# Altium footprint library Sajad_Altium_Library.PcbLib: 380 footprints (part 2 of 24)
Each footprint in its own frame and in the unit in brackets; x right, y up, seen from the top. Pads: shape width x height; smd on the part's side, far side on the other; paste and mask are expansions set on the pad; w line width, h text height; cw(c..) or ccw(c..) is an arc to the next point about the centre after c.
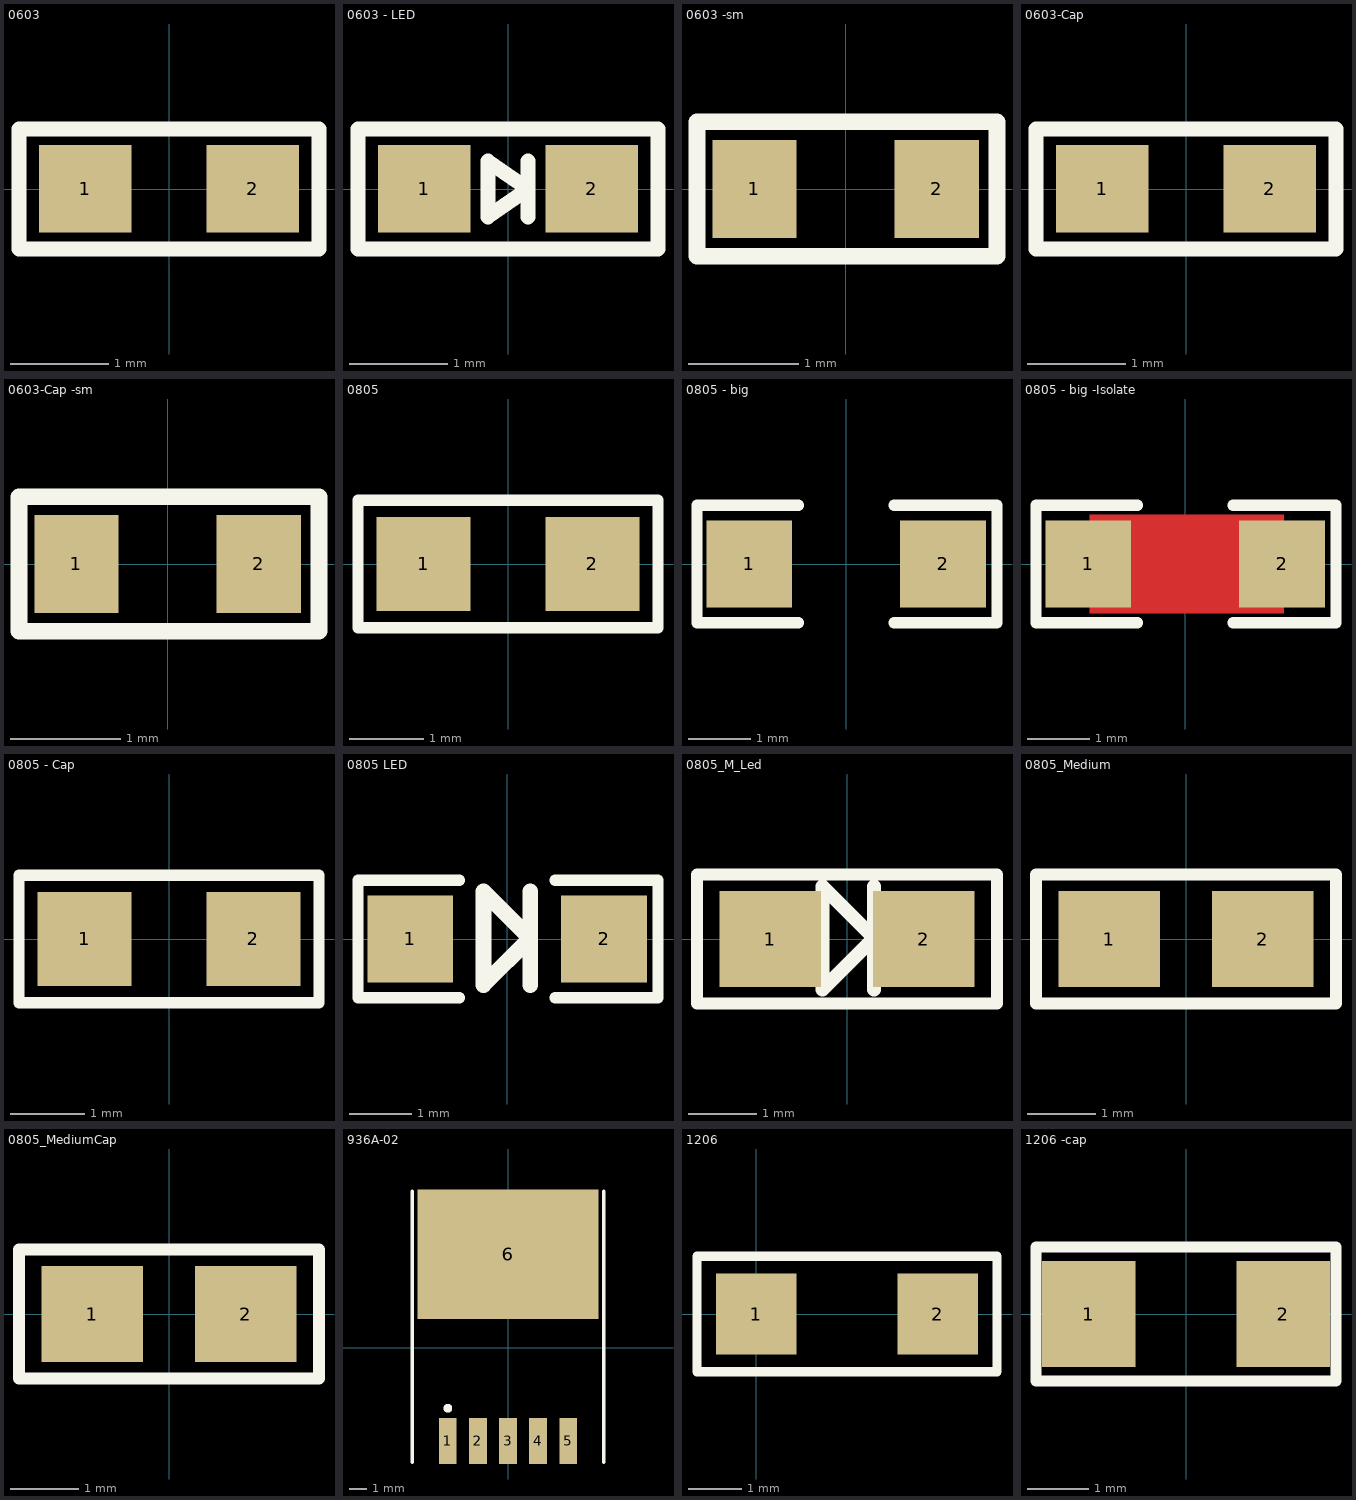
[diagram p1: the footprints below, top view; thin cyan lines are the x and y axes]

## 0603 [mil]
pads (2):
  rect 37x35 smd: 1(-33.5,0) 2(33.5,0)
Top Overlay:
  lines w6: -60,-24 0,-24 60,-24 60,24 0,24 -60,24 -60,-24
3D body: height 11.89, standoff 0, extent -31.49,-15.74 31.5,15.75

## 0603 - LED [mil]
pads (2):
  rect 37x35 smd: 1(-33.5,0) 2(33.5,0)
Top Overlay:
  lines w4: 8,-11.12 8,11.12 ; -8.06,-11.12 -8.06,11.12 8,0 -8.06,-11.12
  lines w6: 8,-11.12 8,11.12 ; -60,-24 -60,24 0,24 60,24 60,-24 0,-24 -60,-24 ; -8.06,-11.12 -8.06,11.12 8,0 -8.06,-11.12
3D body: height 43.31, standoff 0, extent -31.88,-15.74 31.9,15.75

## 0603 -sm [mil]
pads (2):
  rect 30x35 smd: 1(-32.5,0) 2(32.5,0)
Top Overlay:
  lines w6: -53,-24 0,-24 54,-24 54,24 0,24 -53,24 -53,-24
3D body: height 11.89, standoff 0, extent -31.49,-15.74 31.5,15.75

## 0603-Cap [mil]
pads (2):
  rect 37x35 smd: 1(-33.5,0) 2(33.5,0)
Top Overlay:
  lines w6: -60,-24 -60,24 0,24 60,24 60,-24 0,-24 -60,-24
3D body: height 31.5, standoff 0, extent -31.5,-15.75 31.5,15.75

## 0603-Cap -sm [mil]
pads (2):
  rect 30x35 smd: 1(-32.5,0) 2(32.5,0)
Top Overlay:
  lines w6: -53,-24 0,-24 54,-24 54,24 0,24 -53,24 -53,-24
3D body: height 31.5, standoff 0, extent -31.5,-15.75 31.5,15.75

## 0805 [mil]
pads (2):
  rect 50x50 smd: 1(-45,0) 2(45,0)
Top Overlay:
  lines w6: -80,-34 -80,34 80,34 80,-34 -80,-34
3D body: height 20.79, standoff 0, extent -57.67,-27.65 60.44,27.47

## 0805 - big [mil]
pads (2):
  rect 54x55 smd: 1(-61,0) 2(61,0)
Top Overlay:
  lines w7: -30,-37 -94,-37 -94,37 -30,37 ; 30,-37 95,-37 95,37 30,37
3D body: height 20.79, standoff 0, extent -57.67,-27.66 60.44,27.46

## 0805 - big -Isolate [mil]
pads (2):
  rect 54x55 smd: 1(-61,0) 2(61,0)
Top Layer:
  pour cut-out: -60,31 -60,-31 62,-31 62,31
Top Overlay:
  lines w7: -30,-37 -94,-37 -94,37 -30,37 ; 30,-37 95,-37 95,37 30,37
3D body: height 20.79, standoff 0, extent -57.67,-27.66 60.44,27.46

## 0805 - Cap [mil]
pads (2):
  rect 50x50 smd: 1(-45,0) 2(45,0)
Top Overlay:
  lines w6: -80,-34 -80,34 80,34 80,-34 -80,-34
3D body: height 23.62, standoff 0, extent -39.37,-24.61 39.37,24.6

## 0805 LED [mil]
pads (2):
  rect 54x55 smd: 1(-61,0) 2(61,0)
Top Overlay:
  lines w7: -30,-37 -94,-37 -94,37 -30,37 ; 30,-37 95,-37 95,37 30,37
  lines w10: 14.5,-29 14.5,30 ; -15,-29 -15,30 14.5,0.5 -15,-29
3D body: height 43.31, standoff 0, extent -39.76,-24.6 39.77,24.61

## 0805_M_Led [mil]
pads (2):
  rect 58x55 smd: 1(-44,0) 2(44,0)
Top Overlay:
  lines w7: -86,-37 86,-37 86,37 -86,37 -86,-37
  lines w8: 15.5,-29 15.5,30 ; -14,-29 15.5,0.5 -14,30 -14,-29
3D body: height 43.31, standoff 0, extent -39.76,-24.6 39.77,24.61

## 0805_Medium [mil]
pads (2):
  rect 58x55 smd: 1(-44,0) 2(44,0)
Top Overlay:
  lines w7: -86,-37 -86,37 86,37 86,-37 -86,-37
3D body: height 29.92, standoff 0, extent -75.27,-26.58 75.25,26.57

## 0805_MediumCap [mil]
pads (2):
  rect 58x55 smd: 1(-44,0) 2(44,0)
Top Overlay:
  lines w7: -86,-37 -86,37 86,37 86,-37 -86,-37
3D body: height 24.8, standoff 1.18, extent -62.34,-24.6 62.35,24.62

## 936A-02 [mm] "D2-PAK; 5 Leads; Body 14.7 (inc. leads) x 10.2 mm (LxW max)"
height 4.58
pads (6):
  rect 1x2.6 smd: 1(-3.4,-5.275) 2(-1.7,-5.275) 3(0,-5.275) 4(1.7,-5.275) 5(3.4,-5.275)
  rect 10.2x7.3 smd: 6(0,5.275)
Top Overlay:
  circle w0.25: c-3.4,-3.425 r0.125
  lines w0.2: -5.4,-6.475 -5.4,8.825 ; 5.4,-6.475 5.4,8.825
3D body: height 4.56, standoff 0, extent -5.08,-5.659 5.08,8.356

## 1206 [mil]
pads (2):
  rect 60x60 smd: 1(0,0) 2(135,0)
Top Overlay:
  lines w7: -44,-43 103,-43 179,-43 179,43 103,43 -44,43 -44,-43
3D body: height 39.45, standoff 0, extent 7.01,-33 132.99,30

## 1206 -cap [mil]
pads (2):
  rect 60x68 smd: 1(-62.5,0) 2(62.5,0)
Top Overlay:
  lines w7: -96.5,-43 35.5,-43 96.5,-43 96.5,43 35.5,43 -96.5,43 -96.5,-43
3D body: height 39.45, standoff 0, extent -62.99,-31.49 63,31.5